# Altium integrated library PlantiumIntegratedLibrary.IntLib: 638 symbols (part 6 of 6)
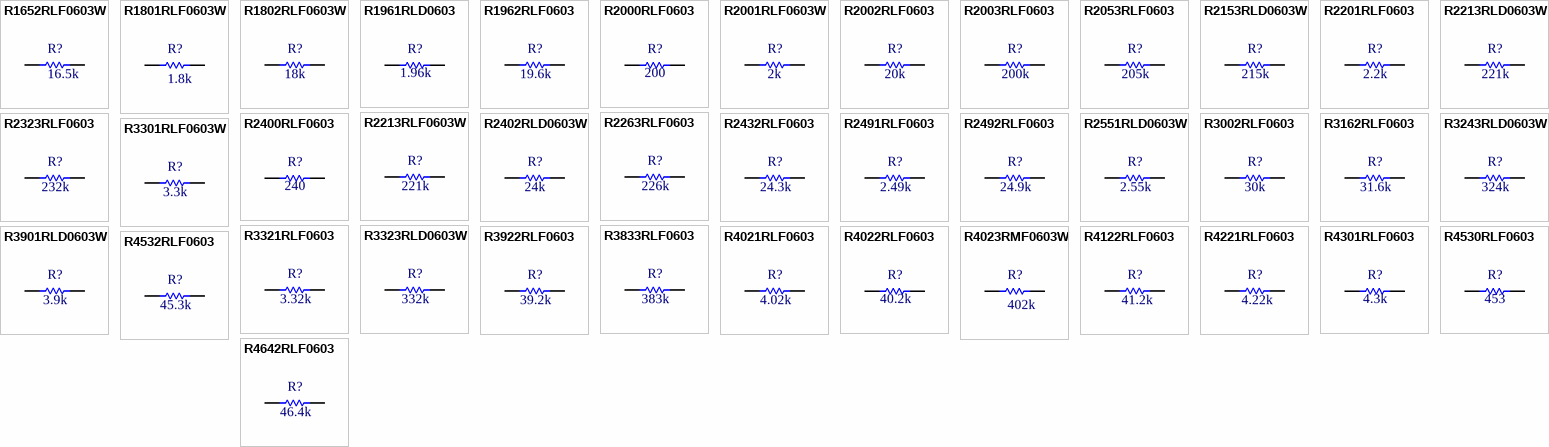
[diagram p38: symbols R1652RLF0603W to R4642RLF0603]

## R2432RLF0603
designator R?  value 24.3k
24.3 kOhms ±1% 0.1W, 1/10W Chip Resistor 0603 (1608 Metric) Automotive AEC-Q200 Thick Film; Manufacturer Part Number: ERJ-3EKF2432V; Manufacturer: Panasonic Electronic Components; Working Temperature: -55°C ~ 155°C; Temperature Coefficient: ±100ppm/°C; Short Description: RES SMD 24.3K OHM 1% 1/10W 0603; Ratings: REACH, ROHS3, AEC-Q200; Frequency: NC; Mounting: SMT; Power: 1/10W; Type: NC; Alternate Part Number 1: *; Alternate Part Number 2: *; Tolerance: ±1%; Current: NC; Revision Date: 02/08/21; Package Reference: 0603; Voltage: NC
footprint R0603 (Footprint not found)
pins: 1, 2

## R2491RLF0603
designator R?  value 2.49k
2.49 kOhms ±1% 0.1W, 1/10W Chip Resistor 0603 (1608 Metric) Automotive AEC-Q200 Thick Film; Manufacturer Part Number: ERJ-3EKF2491V; Manufacturer: Panasonic Electronic Components; Working Temperature: -55°C ~ 155°C; Temperature Coefficient: ±100ppm/°C; Short Description: RES SMD 2.49K OHM 1% 1/10W 0603; Ratings: REACH, ROHS3; Frequency: NC; Mounting: SMT; Power: 1/10W; Type: NC; Alternate Part Number 1: *; Alternate Part Number 2: *; Tolerance: ±1%; Current: NC; Revision Date: 11/05/22; Package Reference: 0603; Voltage: NC
footprint R0603 (Footprint not found)
pins: 1, 2

## R2492RLF0603
designator R?  value 24.9k
24.9 kOhms ±1% 0.1W, 1/10W Chip Resistor 0603 (1608 Metric) Automotive AEC-Q200 Thick Film; Manufacturer Part Number: ERJ-3EKF2492V; Manufacturer: Panasonic Electronic Components; Working Temperature: -55°C ~ 155°C; Temperature Coefficient: ±100ppm/°C; Short Description: RES SMD 24.9K OHM 1% 1/10W 0603; Ratings: REACH, ROHS3, AEC-Q200; Frequency: NC; Mounting: SMT; Power: 1/10W; Type: NC; Alternate Part Number 1: *; Alternate Part Number 2: *; Tolerance: ±1%; Current: NC; Revision Date: 02/08/21; Package Reference: 0603; Voltage: NC
footprint R0603 (Footprint not found)
pins: 1, 2

## R2551RLD0603W
designator R?  value 2.55k
2.55 kOhms ±0.5% 0.1W, 1/10W Chip Resistor 0603 (1608 Metric) - Thin Film; Manufacturer Part Number: RT0603DRD072K55L; Manufacturer: Yageo; Working Temperature: -55°C ~ 155°C; Temperature Coefficient: ±25ppm/°C; Short Description: RES SMD 2.55KOHM 0.5% 1/10W 0603; Ratings: REACH, ROHS3; Frequency: NC; Mounting: SMT; Power: 1/10W; Type: NC; Alternate Part Number 1: *; Alternate Part Number 2: *; Tolerance: ±0.5%; Current: NC; Revision Date: 02/08/21; Package Reference: 0603; Voltage: NC
footprint R0603 (Footprint not found)
pins: 1, 2

## R3002RLF0603
designator R?  value 30k
30 kOhms ±1% 0.1W, 1/10W Chip Resistor 0603 (1608 Metric) Automotive AEC-Q200 Thick Film; Manufacturer Part Number: ERJ-3EKF3002V; Manufacturer: Panasonic Electronic Components; Working Temperature: -55°C ~ 155°C; Temperature Coefficient: ±100ppm/°C; Short Description: RES SMD 30K OHM 1% 1/10W 0603; Ratings: REACH, ROHS3, AEC-Q200; Frequency: NC; Mounting: SMT; Power: 1/10W; Type: NC; Alternate Part Number 1: *; Alternate Part Number 2: *; Tolerance: ±1%; Current: NC; Revision Date: 02/08/21; Package Reference: 0603; Voltage: NC
footprint R0603 (Footprint not found)
pins: 1, 2

## R3162RLF0603
designator R?  value 31.6k
31.6 kOhms ±1% 0.1W, 1/10W Chip Resistor 0603 (1608 Metric) Automotive AEC-Q200 Thick Film; Manufacturer Part Number: ERJ-3EKF3162V; Manufacturer: Panasonic Electronic Components; Working Temperature: -55°C ~ 155°C; Temperature Coefficient: ±100ppm/°C; Short Description: RES SMD 31.6K OHM 1% 1/10W 0603; Ratings: REACH, ROHS3, AEC-Q200; Frequency: NC; Mounting: SMT; Power: 1/10W; Type: NC; Alternate Part Number 1: *; Alternate Part Number 2: *; Tolerance: ±1%; Current: NC; Revision Date: 02/08/21; Package Reference: 0603; Voltage: NC
footprint R0603 (Footprint not found)
pins: 1, 2

## R3243RLD0603W
designator R?  value 324k
324 kOhms ±0.5% 0.1W, 1/10W Chip Resistor 0603 (1608 Metric) - Thin Film; Manufacturer Part Number: RT0603DRD07324KL; Manufacturer: Yageo; Working Temperature: -55°C ~ 155°C; Temperature Coefficient: ±25ppm/°C; Short Description: RES SMD 324K OHM 0.5% 1/10W 0603; Ratings: REACH, ROHS3; Frequency: NC; Mounting: SMT; Power: 1/10W; Type: NC; Alternate Part Number 1: *; Alternate Part Number 2: *; Tolerance: ±0.5%; Current: NC; Revision Date: 02/08/21; Package Reference: 0603; Voltage: NC
footprint R0603 (Footprint not found)
pins: 1, 2

## R3301RLF0603W
designator R?  value 3.3k
3.3 kOhms ±1% 0.1W, 1/10W Chip Resistor 0603 (1608 Metric) Moisture Resistant Thick Film; Manufacturer Part Number: RC0603FR-073K3L; Manufacturer: Yageo; Working Temperature: -55°C ~ 155°C; Temperature Coefficient: ±100ppm/°C; Short Description: RES SMD 3.3K OHM 1% 1/10W 0603; Ratings: REACH, ROHS3; Frequency: NC; Mounting: SMT; Power: 1/10W; Type: NC; Alternate Part Number 1: *; Alternate Part Number 2: *; Tolerance: ±1%; Current: NC; Revision Date: 02/08/21; Package Reference: 0603; Voltage: NC
footprint R0603 (Footprint not found)
pins: 1, 2

## R3321RLF0603
designator R?  value 3.32k
3.32 kOhms ±1% 0.1W, 1/10W Chip Resistor 0603 (1608 Metric) Automotive AEC-Q200 Thick Film; Manufacturer Part Number: ERJ-3EKF3321V; Manufacturer: Panasonic Electronic Components; Working Temperature: -55°C ~ 155°C; Temperature Coefficient: ±100ppm/°C; Short Description: RES SMD 3.32K OHM 1% 1/10W 0603; Ratings: REACH, ROHS3, AEC-Q200; Frequency: NC; Mounting: SMT; Power: 1/10W; Type: NC; Alternate Part Number 1: *; Alternate Part Number 2: *; Tolerance: ±1%; Current: NC; Revision Date: 02/08/21; Package Reference: 0603; Voltage: NC
footprint R0603 (Footprint not found)
pins: 1, 2

## R3323RLD0603W
designator R?  value 332k
332 kOhms ±0.5% 0.1W, 1/10W Chip Resistor 0603 (1608 Metric) - Thin Film; Manufacturer Part Number: RT0603DRD07332KL; Manufacturer: Yageo; Working Temperature: -55°C ~ 155°C; Temperature Coefficient: ±25ppm/°C; Short Description: RES SMD 332K OHM 0.5% 1/10W 0603; Ratings: REACH, ROHS3; Frequency: NC; Mounting: SMT; Power: 1/10W; Type: NC; Alternate Part Number 1: *; Alternate Part Number 2: *; Tolerance: ±0.5%; Current: NC; Revision Date: 02/08/21; Package Reference: 0603; Voltage: NC
footprint R0603 (Footprint not found)
pins: 1, 2

## R3833RLF0603
designator R?  value 383k
383 kOhms ±1% 0.1W, 1/10W Chip Resistor 0603 (1608 Metric) Automotive AEC-Q200 Thick Film; Manufacturer Part Number: ERJ-3EKF3833V; Manufacturer: Panasonic Electronic Components; Working Temperature: -55°C ~ 155°C; Temperature Coefficient: ±100ppm/°C; Short Description: RES SMD 383K OHM 1% 1/10W 0603; Ratings: REACH, ROHS3, AEC-Q200; Frequency: NC; Mounting: SMT; Power: 1/10W; Type: NC; Alternate Part Number 1: *; Alternate Part Number 2: *; Tolerance: ±1%; Current: NC; Revision Date: 09/05/23; Package Reference: 0603; Voltage: NC
footprint R0603 (Footprint not found)
pins: 1, 2

## R3901RLD0603W
designator R?  value 3.9k
3.9 kOhms ±0.5% 0.1W, 1/10W Chip Resistor 0603 (1608 Metric) - Thin Film; Manufacturer Part Number: RT0603DRD073K9L; Manufacturer: Yageo; Working Temperature: -55°C ~ 155°C; Temperature Coefficient: ±25ppm/°C; Short Description: RES SMD 3.9K OHM 0.5% 1/10W 0603; Ratings: REACH, ROHS3; Frequency: NC; Mounting: SMT; Power: 1/10W; Type: NC; Alternate Part Number 1: *; Alternate Part Number 2: *; Tolerance: ±0.5%; Current: NC; Revision Date: 02/08/21; Package Reference: 0603; Voltage: NC
footprint R0603 (Footprint not found)
pins: 1, 2

## R3922RLF0603
designator R?  value 39.2k
39.2 kOhms ±1% 0.1W, 1/10W Chip Resistor 0603 (1608 Metric) Automotive AEC-Q200 Thick Film; Manufacturer Part Number: ERJ-3EKF3922V; Manufacturer: Panasonic Electronic Components; Working Temperature: -55°C ~ 155°C; Temperature Coefficient: ±100ppm/°C; Short Description: RES SMD 39.2K OHM 1% 1/10W 0603; Ratings: REACH, ROHS3, AEC-Q200; Frequency: NC; Mounting: SMT; Power: 1/10W; Type: NC; Alternate Part Number 1: *; Alternate Part Number 2: *; Tolerance: ±1%; Current: NC; Revision Date: 02/08/21; Package Reference: 0603; Voltage: NC
footprint R0603 (Footprint not found)
pins: 1, 2

## R4021RLF0603
designator R?  value 4.02k
4.02 kOhms ±1% 0.1W, 1/10W Chip Resistor 0603 (1608 Metric) Automotive AEC-Q200 Thick Film; Manufacturer Part Number: ERJ-3EKF4021V; Manufacturer: Panasonic Electronic Components; Working Temperature: -55°C ~ 155°C; Temperature Coefficient: ±100ppm/°C; Short Description: RES SMD 4.02K OHM 1% 1/10W 0603; Ratings: REACH, ROHS3, AEC-Q200; Frequency: NC; Mounting: SMT; Power: 1/10W; Type: NC; Alternate Part Number 1: *; Alternate Part Number 2: *; Tolerance: ±1%; Current: NC; Revision Date: 02/08/21; Package Reference: 0603; Voltage: NC
footprint R0603 (Footprint not found)
pins: 1, 2

## R4022RLF0603
designator R?  value 40.2k
40.2 kOhms ±1% 0.1W, 1/10W Chip Resistor 0603 (1608 Metric) Automotive AEC-Q200 Thick Film; Manufacturer Part Number: ERJ-3EKF4022V; Manufacturer: Panasonic Electronic Components; Working Temperature: -55°C ~ 155°C; Temperature Coefficient: ±100ppm/°C; Short Description: RES SMD 40.2K OHM 1% 1/10W 0603; Ratings: REACH, ROHS3, AEC-Q200; Frequency: NC; Mounting: SMT; Power: 1/10W; Type: NC; Alternate Part Number 1: *; Alternate Part Number 2: *; Tolerance: ±1%; Current: NC; Revision Date: 02/08/21; Package Reference: 0603; Voltage: NC
footprint R0603 (Footprint not found)
pins: 1, 2

## R4023RMF0603W
designator R?  value 402k
402 kOhms ±1% 0.125W, 1/8W Chip Resistor 0805 (2012 Metric) Moisture Resistant Thick Film; Manufacturer Part Number: RC0805FR-07402KL; Manufacturer: YAGEO; Working Temperature: -55°C ~ 155°C; Temperature Coefficient: ±100ppm/°C; Short Description: RES 402K OHM 1% 1/8W 0805; Ratings: REACH, ROHS3; Frequency: NC; Mounting: SMT; Power: 1/8W; Type: NC; Alternate Part Number 1: *; Alternate Part Number 2: *; Tolerance: ±1%; Current: NC; Revision Date: 24/11/21; Package Reference: 0603; Voltage: NC
footprint R0603 (Footprint not found)
pins: 1, 2

## R4122RLF0603
designator R?  value 41.2k  (hidden comment: R4122RLF0603)
41.2 kOhms ±1% 0.1W, 1/10W Chip Resistor 0603 (1608 Metric) Automotive AEC-Q200 Thick Film; Manufacturer Part Number: ERJ-3EKF4122V; Manufacturer: Panasonic Electronic Components; Working Temperature: -55°C ~ 155°C; Temperature Coefficient: ±100ppm/°C; Short Description: RES SMD 41.2K OHM 1% 1/10W 0603; Ratings: REACH, ROHS3, AEC-Q200; Frequency: NC; Mounting: SMT; Power: 1/10W; Type: NC; Alternate Part Number 1: *; Alternate Part Number 2: *; Tolerance: ±1%; Current: NC; Revision Date: 02/08/21; Package Reference: 0603; Voltage: NC
footprint R0603 (Footprint not found)
pins: 1, 2

## R4221RLF0603
designator R?  value 4.22k
4.22 kOhms ±1% 0.1W, 1/10W Chip Resistor 0603 (1608 Metric) Automotive AEC-Q200 Thick Film; Manufacturer Part Number: ERJ-3EKF4221V; Manufacturer: Panasonic Electronic Components; Working Temperature: -55°C ~ 155°C; Temperature Coefficient: ±100ppm/°C; Short Description: RES SMD 4.22K OHM 1% 1/10W 0603; Ratings: REACH, ROHS3, AEC-Q200; Frequency: NC; Mounting: SMT; Power: 1/10W; Type: NC; Alternate Part Number 1: *; Alternate Part Number 2: *; Tolerance: ±1%; Current: NC; Revision Date: 02/08/21; Package Reference: 0603; Voltage: NC
footprint R0603 (Footprint not found)
pins: 1, 2

## R4301RLF0603
designator R?  value 4.3k
4.3 kOhms ±1% 0.1W, 1/10W Chip Resistor 0603 (1608 Metric) Automotive AEC-Q200 Thick Film; Manufacturer Part Number: ERJ-3EKF4301V; Manufacturer: Panasonic Electronic Components; Working Temperature: -55°C ~ 155°C; Temperature Coefficient: ±100ppm/°C; Short Description: RES SMD 4.3K OHM 1% 1/10W 0603; Ratings: REACH, ROHS3, AEC-Q200; Frequency: NC; Mounting: SMT; Power: 1/10W; Type: NC; Alternate Part Number 1: *; Alternate Part Number 2: *; Tolerance: ±1%; Current: NC; Revision Date: 02/08/21; Package Reference: 0603; Voltage: NC
footprint R0603 (Footprint not found)
pins: 1, 2

## R4530RLF0603
designator R?  value 453
453 Ohms ±1% 0.1W, 1/10W Chip Resistor 0603 (1608 Metric) Automotive AEC-Q200 Thick Film; Manufacturer Part Number: ERJ-3EKF4530V; Manufacturer: Panasonic Electronic Components; Working Temperature: -55°C ~ 155°C; Temperature Coefficient: ±100ppm/°C; Short Description: RES SMD 453 OHM 1% 1/10W 0603; Ratings: REACH, ROHS3, AEC-Q200; Frequency: NC; Mounting: SMT; Power: 1/10W; Type: NC; Alternate Part Number 1: *; Alternate Part Number 2: *; Tolerance: ±1%; Current: NC; Revision Date: 02/08/21; Package Reference: 0603; Voltage: NC
footprint R0603 (Footprint not found)
pins: 1, 2

## R4532RLF0603
designator R?  value 45.3k
45.3 kOhms ±1% 0.1W, 1/10W Chip Resistor 0603 (1608 Metric) Automotive AEC-Q200 Thick Film; Manufacturer Part Number: ERJ-3EKF4532V; Manufacturer: Panasonic Electronic Components; Working Temperature: -55°C ~ 155°C; Temperature Coefficient: ±100ppm/°C; Short Description: RES SMD 45.3K OHM 1% 1/10W 0603; Ratings: REACH, ROHS3, AEC-Q200; Frequency: NC; Mounting: SMT; Power: 1/10W; Type: NC; Alternate Part Number 1: *; Alternate Part Number 2: *; Tolerance: ±1%; Current: NC; Revision Date: 02/08/21; Package Reference: 0603; Voltage: NC
footprint R0603 (Footprint not found)
pins: 1, 2

## R4642RLF0603
designator R?  value 46.4k  (hidden comment: R4642RLF0603)
46.4 kOhms ±1% 0.1W, 1/10W Chip Resistor 0603 (1608 Metric) - Thin Film; Manufacturer Part Number: ERJ-3EKF4642V; Manufacturer: Panasonic; Working Temperature: -55°C ~ 155°C; Temperature Coefficient: ±100ppm/°C; Short Description: RES SMD 46.4 KOHM 1% 1/10W 0603; Ratings: REACH, ROHS3; Frequency: NC; Mounting: SMT; Power: 1/10W; Type: NC; Alternate Part Number 1: *; Alternate Part Number 2: *; Tolerance: ±1%; Current: NC; Revision Date: 02/08/21; Package Reference: 0603; Voltage: NC
footprint R0603 (Footprint not found)
pins: 1, 2

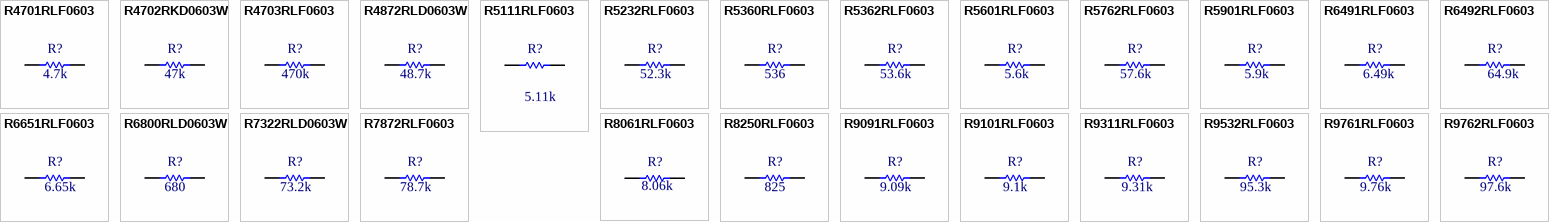
[diagram p33: symbols R4701RLF0603 to R9762RLF0603]

## R4701RLF0603
designator R?  value 4.7k
4.7 kOhms ±1% 0.1W, 1/10W Chip Resistor 0603 (1608 Metric) Automotive AEC-Q200 Thick Film; Manufacturer Part Number: ERJ-3EKF4701V; Manufacturer: Panasonic Electronic Components; Working Temperature: -55°C ~ 155°C; Temperature Coefficient: ±100ppm/°C; Short Description: RES SMD 4.7K OHM 1% 1/10W 0603; Ratings: REACH, ROHS3, AEC-Q200; Frequency: NC; Mounting: SMT; Power: 1/10W; Type: NC; Alternate Part Number 1: *; Alternate Part Number 2: *; Tolerance: ±1%; Current: NC; Revision Date: 02/08/21; Package Reference: 0603; Voltage: NC
footprint R0603 (Footprint not found)
pins: 1, 2

## R4702RKD0603W
designator R?  value 47k
47 kOhms ±0.5% 0.063W, 1/16W Chip Resistor 0603 (1608 Metric) - Thin Film; Manufacturer Part Number: RR0816P-473-D; Manufacturer: Susumu; Working Temperature: -55°C ~ 155°C; Temperature Coefficient: ±25ppm/°C; Short Description: RES SMD 47K OHM 0.5% 1/16W 0603; Ratings: REACH, ROHS3; Frequency: NC; Mounting: SMT; Power: 1/16W; Type: NC; Alternate Part Number 1: *; Alternate Part Number 2: *; Tolerance: ±0.5%; Current: NC; Revision Date: 02/08/21; Package Reference: 0603; Voltage: NC
footprint R0603 (Footprint not found)
pins: 1, 2

## R4703RLF0603
designator R?  value 470k
470 kOhms ±1% 0.1W, 1/10W Chip Resistor 0603 (1608 Metric) Automotive AEC-Q200 Thick Film; Manufacturer Part Number: ERJ-3EKF4703V; Manufacturer: Panasonic Electronic Components; Working Temperature: -55°C ~ 155°C; Temperature Coefficient: ±100ppm/°C; Short Description: RES SMD 470K OHM 1% 1/10W 0603; Ratings: REACH, ROHS3, AEC-Q200; Frequency: NC; Mounting: SMT; Power: 1/10W; Type: NC; Alternate Part Number 1: *; Alternate Part Number 2: *; Tolerance: ±1%; Current: NC; Revision Date: 02/08/21; Package Reference: 0603; Voltage: NC
footprint R0603 (Footprint not found)
pins: 1, 2

## R4872RLD0603W
designator R?  value 48.7k
48.7 kOhms ±0.5% 0.1W, 1/10W Chip Resistor 0603 (1608 Metric) - Thin Film; Manufacturer Part Number: RT0603DRD0748K7L; Manufacturer: Yageo; Working Temperature: -55°C ~ 155°C; Temperature Coefficient: ±25ppm/°C; Short Description: RES SMD 48.7KOHM 0.5% 1/10W 0603; Ratings: REACH, ROHS3; Frequency: NC; Mounting: SMT; Power: 1/10W; Type: NC; Alternate Part Number 1: *; Alternate Part Number 2: *; Tolerance: ±0.5%; Current: NC; Revision Date: 02/08/21; Package Reference: 0603; Voltage: NC
footprint R0603 (Footprint not found)
pins: 1, 2

## R5111RLF0603
designator R?  value 5.11k
5.11 kOhms ±1% 0.1W, 1/10W Chip Resistor 0603 (1608 Metric) Automotive AEC-Q200 Thick Film; Manufacturer Part Number: ERJ-3EKF5111V; Manufacturer: Panasonic Electronic Components; Working Temperature: -55°C ~ 155°C; Temperature Coefficient: ±100ppm/°C; Short Description: RES SMD 5.11K OHM 1% 1/10W 0603; Ratings: REACH, ROHS3, AEC-Q200; Frequency: NC; Mounting: SMT; Power: 1/10W; Type: NC; Alternate Part Number 1: *; Alternate Part Number 2: *; Tolerance: ±1%; Current: NC; Revision Date: 02/08/21; Package Reference: 0603; Voltage: NC
footprint R0603 (Footprint not found)
pins: 1, 2

## R5232RLF0603
designator R?  value 52.3k
52.3 kOhms ±1% 0.1W, 1/10W Chip Resistor 0603 (1608 Metric) Automotive AEC-Q200 Thick Film; Manufacturer Part Number: ERJ-3EKF5232V; Manufacturer: Panasonic Electronic Components; Working Temperature: -55°C ~ 155°C; Temperature Coefficient: ±100ppm/°C; Short Description: RES SMD 52.3K OHM 1% 1/10W 0603; Ratings: REACH, ROHS3, AEC-Q200; Frequency: NC; Mounting: SMT; Power: 1/10W; Type: NC; Alternate Part Number 1: *; Alternate Part Number 2: *; Tolerance: ±1%; Current: NC; Revision Date: 02/08/21; Package Reference: 0603; Voltage: NC
footprint R0603 (Footprint not found)
pins: 1, 2

## R5360RLF0603
designator R?  value 536
536 Ohms ±1% 0.1W, 1/10W Chip Resistor 0603 (1608 Metric) Automotive AEC-Q200 Thick Film; Manufacturer Part Number: ERJ-3EKF5360V; Manufacturer: Panasonic Electronic Components; Working Temperature: -55°C ~ 155°C; Temperature Coefficient: ±100ppm/°C; Short Description: RES SMD 536 OHM 1% 1/10W 0603; Ratings: REACH, ROHS3, AEC-Q200; Frequency: NC; Mounting: SMT; Power: 1/10W; Type: NC; Alternate Part Number 1: *; Alternate Part Number 2: *; Tolerance: ±1%; Current: NC; Revision Date: 02/08/21; Package Reference: 0603; Voltage: NC
footprint R0603 (Footprint not found)
pins: 1, 2

## R5362RLF0603
designator R?  value 53.6k
53.6 kOhms ±1% 0.1W, 1/10W Chip Resistor 0603 (1608 Metric) Automotive AEC-Q200 Thick Film; Manufacturer Part Number: ERJ-3EKF5362V; Manufacturer: Panasonic Electronic Components; Working Temperature: -55°C ~ 155°C; Temperature Coefficient: ±100ppm/°C; Short Description: RES SMD 53.6K OHM 1% 1/10W 0603; Ratings: REACH, ROHS3, AEC-Q200; Frequency: NC; Mounting: SMT; Power: 1/10W; Type: NC; Alternate Part Number 1: *; Alternate Part Number 2: *; Tolerance: ±1%; Current: NC; Revision Date: 02/08/21; Package Reference: 0603; Voltage: NC
footprint R0603 (Footprint not found)
pins: 1, 2

## R5601RLF0603
designator R?  value 5.6k
5.6 kOhms ±1% 0.1W, 1/10W Chip Resistor 0603 (1608 Metric) Automotive AEC-Q200 Thick Film; Manufacturer Part Number: ERJ-3EKF5601V; Manufacturer: Panasonic Electronic Components; Working Temperature: -55°C ~ 155°C; Temperature Coefficient: ±100ppm/°C; Short Description: RES SMD 5.6K OHM 1% 1/10W 0603; Ratings: REACH, ROHS3, AEC-Q200; Frequency: NC; Mounting: SMT; Power: 1/10W; Type: NC; Alternate Part Number 1: *; Alternate Part Number 2: *; Tolerance: ±1%; Current: NC; Revision Date: 02/08/21; Package Reference: 0603; Voltage: NC
footprint R0603 (Footprint not found)
pins: 1, 2

## R5762RLF0603
designator R?  value 57.6k
57.6 kOhms ±1% 0.1W, 1/10W Chip Resistor 0603 (1608 Metric) Automotive AEC-Q200 Thick Film; Manufacturer Part Number: ERJ-3EKF5762V; Manufacturer: Panasonic Electronic Components; Working Temperature: -55°C ~ 155°C; Temperature Coefficient: ±100ppm/°C; Short Description: RES SMD 57.6K OHM 1% 1/10W 0603; Ratings: REACH, ROHS3, AEC-Q200; Frequency: NC; Mounting: SMT; Power: 1/10W; Type: NC; Alternate Part Number 1: *; Alternate Part Number 2: *; Tolerance: ±1%; Current: NC; Revision Date: 02/08/21; Package Reference: 0603; Voltage: NC
footprint R0603 (Footprint not found)
pins: 1, 2

## R5901RLF0603
designator R?  value 5.9k
5.9 kOhms ±1% 0.1W, 1/10W Chip Resistor 0603 (1608 Metric) Automotive AEC-Q200 Thick Film; Manufacturer Part Number: ERJ-3EKF5901V; Manufacturer: Panasonic Electronic Components; Working Temperature: -55°C ~ 155°C; Temperature Coefficient: ±100ppm/°C; Short Description: RES SMD 5.9K OHM 1% 1/10W 0603; Ratings: REACH, ROHS3, AEC-Q200; Frequency: NC; Mounting: SMT; Power: 1/10W; Type: NC; Alternate Part Number 1: *; Alternate Part Number 2: *; Tolerance: ±1%; Current: NC; Revision Date: 02/08/21; Package Reference: 0603; Voltage: NC
footprint R0603 (Footprint not found)
pins: 1, 2

## R6491RLF0603
designator R?  value 6.49k
6.49 kOhms ±1% 0.1W, 1/10W Chip Resistor 0603 (1608 Metric) Automotive AEC-Q200 Thick Film; Manufacturer Part Number: RMCF0603FT6K49; Alternate Part Number 1: AC0603FR-076K49L; Manufacturer: Stackpole Electronics Inc; Working Temperature: -55°C ~ 155°C; Temperature Coefficient: ±100ppm/°C; Short Description: RES 6.49K OHM 1% 1/10W 0603; Ratings: REACH, ROHS3, AEC-Q200; Frequency: NC; Mounting: SMT; Power: 1/10W; Type: NC; Alternate Part Number 2: *; Tolerance: ±1%; Current: NC; Revision Date: 21/10/21; Package Reference: 0603; Voltage: NC
footprint R0603 (Footprint not found)
pins: 1, 2

## R6492RLF0603
designator R?  value 64.9k
64.9 kOhms ±1% 0.1W, 1/10W Chip Resistor 0603 (1608 Metric) Automotive AEC-Q200 Thick Film; Manufacturer Part Number: ERJ-3EKF6492V; Manufacturer: Panasonic Electronic Components; Working Temperature: -55°C ~ 155°C; Temperature Coefficient: ±100ppm/°C; Short Description: RES SMD 64.9K OHM 1% 1/10W 0603; Ratings: REACH, ROHS3, AEC-Q200; Frequency: NC; Mounting: SMT; Power: 1/10W; Type: NC; Alternate Part Number 1: *; Alternate Part Number 2: *; Tolerance: ±1%; Current: NC; Revision Date: 13/10/21; Package Reference: 0603; Voltage: NC
footprint R0603 (Footprint not found)
pins: 1, 2

## R6651RLF0603
designator R?  value 6.65k
6.65k Ohms ±1% 0.1W, 1/10W Chip Resistor 0603 (1608 Metric) Automotive AEC-Q200 Thick Film; Manufacturer Part Number: ERJ-3GEYJ181V; Manufacturer: Panasonic Electronic Components; Working Temperature: -55°C ~ 155°C; Temperature Coefficient: ±100ppm/°C; Short Description: RES 6.65K OHM 1/10W 1% 0603; Ratings: REACH, ROHS3, AEC-Q200; Frequency: NC; Mounting: SMT; Power: 1/10W; Type: NC; Alternate Part Number 1: *; Alternate Part Number 2: *; Tolerance: ±1%; Current: NC; Revision Date: 02/08/21; Package Reference: 0603; Voltage: NC
footprint R0603 (Footprint not found)
pins: 1, 2

## R6800RLD0603W
designator R?  value 680
680 Ohms ±0.5% 0.1W, 1/10W Chip Resistor 0603 (1608 Metric) - Thin Film; Manufacturer Part Number: RT0603DRD07680RL; Manufacturer: Yageo; Working Temperature: -55°C ~ 155°C; Temperature Coefficient: ±25ppm/°C; Short Description: RES SMD 680 OHM 0.5% 1/10W 0603; Ratings: REACH, ROHS3; Frequency: NC; Mounting: SMT; Power: 1/10W; Type: NC; Alternate Part Number 1: *; Alternate Part Number 2: *; Tolerance: ±0.5%; Current: NC; Revision Date: 02/08/21; Package Reference: 0603; Voltage: NC
footprint R0603 (Footprint not found)
pins: 1, 2

## R7322RLD0603W
designator R?  value 73.2k
73.2 kOhms ±0.5% 0.1W, 1/10W Chip Resistor 0603 (1608 Metric) - Thin Film; Manufacturer Part Number: RT0603DRD0773K2L; Manufacturer: Yageo; Working Temperature: -55°C ~ 155°C; Temperature Coefficient: ±25ppm/°C; Short Description: RES SMD 73.2KOHM 0.5% 1/10W 0603; Ratings: REACH, ROHS3; Frequency: NC; Mounting: SMT; Power: 1/10W; Type: NC; Alternate Part Number 1: *; Alternate Part Number 2: *; Tolerance: ±0.5%; Current: NC; Revision Date: 02/08/21; Package Reference: 0603; Voltage: NC
footprint R0603 (Footprint not found)
pins: 1, 2

## R7872RLF0603
designator R?  value 78.7k
78.7 kOhms ±1% 0.1W, 1/10W Chip Resistor 0603 (1608 Metric) Automotive AEC-Q200 Thick Film; Manufacturer Part Number: ERJ-3EKF7872V; Manufacturer: Panasonic Electronic Components; Working Temperature: -55°C ~ 155°C; Temperature Coefficient: ±100ppm/°C; Short Description: RES SMD 78.7K OHM 1% 1/10W 0603; Ratings: REACH, ROHS3, AEC-Q200; Frequency: NC; Mounting: SMT; Power: 1/10W; Type: NC; Alternate Part Number 1: *; Alternate Part Number 2: *; Tolerance: ±1%; Current: NC; Revision Date: 02/08/21; Package Reference: 0603; Voltage: NC
footprint R0603 (Footprint not found)
pins: 1, 2

## R8061RLF0603
designator R?  value 8.06k
8.06 kOhms ±1% 0.1W, 1/10W Chip Resistor 0603 (1608 Metric) Automotive AEC-Q200 Thick Film; Manufacturer Part Number: ERJ-3EKF8061V; Manufacturer: Panasonic Electronic Components; Working Temperature: -55°C ~ 155°C; Temperature Coefficient: ±100ppm/°C; Short Description: RES SMD 8.06K OHM 1% 1/10W 0603; Ratings: REACH, ROHS3, AEC-Q200; Frequency: NC; Mounting: SMT; Power: 1/10W; Type: NC; Alternate Part Number 1: *; Alternate Part Number 2: *; Tolerance: ±1%; Current: NC; Revision Date: 02/08/21; Package Reference: 0603; Voltage: NC
footprint R0603 (Footprint not found)
pins: 1, 2

## R8250RLF0603
designator R?  value 825
825 Ohms ±1% 0.1W, 1/10W Chip Resistor 0603 (1608 Metric) Automotive AEC-Q200 Thick Film; Manufacturer Part Number: ERJ-3EKF8250V; Manufacturer: Panasonic Electronic Components; Working Temperature: -55°C ~ 155°C; Temperature Coefficient: ±100ppm/°C; Short Description: RES SMD 825 OHM 1% 1/10W 0603; Ratings: REACH, ROHS3, AEC-Q200; Frequency: NC; Mounting: SMT; Power: 1/10W; Type: NC; Alternate Part Number 1: *; Alternate Part Number 2: *; Tolerance: ±1%; Current: NC; Revision Date: 02/08/21; Package Reference: 0603; Voltage: NC
footprint R0603 (Footprint not found)
pins: 1, 2

## R9091RLF0603
designator R?  value 9.09k
9.09 kOhms ±1% 0.1W, 1/10W Chip Resistor 0603 (1608 Metric) Automotive AEC-Q200 Thick Film; Manufacturer Part Number: ERJ-3EKF9091V; Manufacturer: Panasonic Electronic Components; Working Temperature: -55°C ~ 155°C; Temperature Coefficient: ±100ppm/°C; Short Description: RES SMD 9.09K OHM 1% 1/10W 0603; Ratings: REACH, ROHS3, AEC-Q200; Frequency: NC; Mounting: SMT; Power: 1/10W; Type: NC; Alternate Part Number 1: *; Alternate Part Number 2: *; Tolerance: ±1%; Current: NC; Revision Date: 02/08/21; Package Reference: 0603; Voltage: NC
footprint R0603 (Footprint not found)
pins: 1, 2

## R9101RLF0603
designator R?  value 9.1k
9.1 kOhms ±1% 0.1W, 1/10W Chip Resistor 0603 (1608 Metric) Automotive AEC-Q200 Thick Film; Manufacturer Part Number: ERJ-3EKF9101V; Manufacturer: Panasonic Electronic Components; Working Temperature: -55°C ~ 155°C; Temperature Coefficient: ±100ppm/°C; Short Description: RES SMD 9.1K OHM 1% 1/10W 0603; Ratings: REACH, ROHS3, AEC-Q200; Frequency: NC; Mounting: SMT; Power: 1/10W; Type: NC; Alternate Part Number 1: *; Alternate Part Number 2: *; Tolerance: ±1%; Current: NC; Revision Date: 02/08/21; Package Reference: 0603; Voltage: NC
footprint R0603 (Footprint not found)
pins: 1, 2

## R9311RLF0603
designator R?  value 9.31k
9.31 kOhms ±1% 0.1W, 1/10W Chip Resistor 0603 (1608 Metric) Automotive AEC-Q200 Thick Film; Manufacturer Part Number: ERJ-3EKF9311V; Manufacturer: Panasonic Electronic Components; Working Temperature: -55°C ~ 155°C; Temperature Coefficient: ±100ppm/°C; Short Description: RES SMD 9.31K OHM 1% 1/10W 0603; Ratings: REACH, ROHS3, AEC-Q200; Frequency: NC; Mounting: SMT; Power: 1/10W; Type: NC; Alternate Part Number 1: *; Alternate Part Number 2: *; Tolerance: ±1%; Current: NC; Revision Date: 02/08/21; Package Reference: 0603; Voltage: NC
footprint R0603 (Footprint not found)
pins: 1, 2

## R9532RLF0603
designator R?  value 95.3k
95.3 kOhms ±1% 0.1W, 1/10W Chip Resistor 0603 (1608 Metric) Automotive AEC-Q200 Thick Film; Manufacturer Part Number: ERJ-3EKF9532V; Manufacturer: Panasonic Electronic Components; Working Temperature: -55°C ~ 155°C; Temperature Coefficient: ±100ppm/°C; Short Description: RES SMD 95.3K OHM 1% 1/10W 0603; Ratings: REACH, ROHS3, AEC-Q200; Frequency: NC; Mounting: SMT; Power: 1/10W; Type: NC; Alternate Part Number 1: *; Alternate Part Number 2: *; Tolerance: ±1%; Current: NC; Revision Date: 02/08/21; Package Reference: 0603; Voltage: NC
footprint R0603 (Footprint not found)
pins: 1, 2

## R9761RLF0603
designator R?  value 9.76k
9.76 kOhms ±1% 0.1W, 1/10W Chip Resistor 0603 (1608 Metric) Automotive AEC-Q200 Thick Film; Manufacturer Part Number: ERJ-3EKF9761V; Manufacturer: Panasonic Electronic Components; Working Temperature: -55°C ~ 155°C; Temperature Coefficient: ±100ppm/°C; Short Description: RES SMD 9.76K OHM 1% 1/10W 0603; Ratings: REACH, ROHS3, AEC-Q200; Frequency: NC; Mounting: SMT; Power: 1/10W; Type: NC; Alternate Part Number 1: *; Alternate Part Number 2: *; Tolerance: ±1%; Current: NC; Revision Date: 02/08/21; Package Reference: 0603; Voltage: NC
footprint R0603 (Footprint not found)
pins: 1, 2

## R9762RLF0603
designator R?  value 97.6k
97.6 kOhms ±1% 0.1W, 1/10W Chip Resistor 0603 (1608 Metric) Automotive AEC-Q200 Thick Film; Manufacturer Part Number: ERJ-3EKF9762V; Manufacturer: Panasonic Electronic Components; Working Temperature: -55°C ~ 155°C; Temperature Coefficient: ±100ppm/°C; Short Description: RES SMD 97.6K OHM 1% 1/10W 0603; Ratings: REACH, ROHS3, AEC-Q200; Frequency: NC; Mounting: SMT; Power: 1/10W; Type: NC; Alternate Part Number 1: *; Alternate Part Number 2: *; Tolerance: ±1%; Current: NC; Revision Date: 02/08/21; Package Reference: 0603; Voltage: NC
footprint R0603 (Footprint not found)
pins: 1, 2


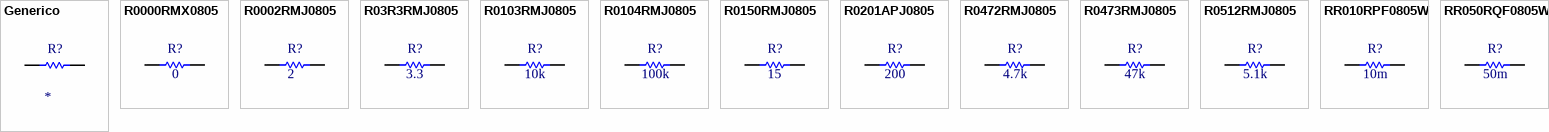
[diagram p34: symbols Generico to RR050RQF0805W]

## Generico
designator R?
Frequency: NC; Manufacturer Part Number: *; Working Temperature: *; Temperature Coefficient: *; Mounting: *; Short Description: *; Power: *; Ratings: *; Type: NC; Alternate Part Number 1: *; Alternate Part Number 2: *; Manufacturer: *; Tolerance: *; Current: NC; Revision Date: *; Package Reference: *; Voltage: NC; Value: *
footprint R0805 (Footprint not found)
pins: 1, 2

## R0000RMX0805
designator R?  value 0
0 Ohms Jumper 0.125W, 1/8W Chip Resistor 0805 (2012 Metric) Automotive AEC-Q200 Thick Film; Manufacturer Part Number: ERJ-6GEY0R00V; Manufacturer: Panasonic Electronic Components; Working Temperature: -55°C ~ 155°C; Short Description: RES 0 OHM 1/8W JUMPER 0805; Ratings: REACH, ROSH3, AEC-Q200; Frequency: NC; Temperature Coefficient: *; Mounting: SMT; Power: 1/8W; Type: NC; Alternate Part Number 1: *; Alternate Part Number 2: *; Tolerance: *; Current: NC; Revision Date: 02/08/21; Package Reference: 0805; Voltage: NC
footprint R0805 (Footprint not found)
pins: 1, 2

## R0002RMJ0805
designator R?  value 2
2 Ohms ±5% 0.125W, 1/8W Chip Resistor 0805 (2012 Metric) Automotive AEC-Q200 Thick Film; Manufacturer Part Number: ERJ-6GEYJ2R0V; Manufacturer: Panasonic Electronic Components; Working Temperature: -55°C ~ 155°C; Temperature Coefficient: -100/ +600ppm/°C; Short Description: RES SMD 2 OHM 5% 1/8W 0805; Ratings: REACH, ROSH3, AEC-Q200; Frequency: NC; Mounting: SMT; Power: 1/8W; Type: NC; Alternate Part Number 1: *; Alternate Part Number 2: *; Tolerance: ±5%; Current: NC; Revision Date: 21/09/21; Package Reference: 0805; Voltage: NC
footprint R0805 (Footprint not found)
pins: 1, 2

## R03R3RMJ0805
designator R?  value 3.3
3.3 Ohms ±5% 0.125W, 1/8W Chip Resistor 0805 (2012 Metric) Automotive AEC-Q200 Thick Film; Manufacturer Part Number: ERJ-6GEYJ3R3V; Manufacturer: Panasonic Electronic Components; Working Temperature: -55°C ~ 155°C; Temperature Coefficient: -100/ +600ppm/°C; Short Description: RES 3.3 OHM 1/8W 5% 0805; Ratings: REACH, ROSH3, AEC-Q200; Frequency: NC; Mounting: SMT; Power: 1/8W; Type: NC; Alternate Part Number 1: *; Alternate Part Number 2: *; Tolerance: ±5%; Current: NC; Revision Date: 02/08/21; Package Reference: 0805; Voltage: NC
footprint R0805 (Footprint not found)
pins: 1, 2

## R0103RMJ0805
designator R?  value 10k
10 kOhms ±5% 0.125W, 1/8W Chip Resistor 0805 (2012 Metric) Automotive AEC-Q200 Thick Film; Manufacturer Part Number: ERJ-6GEYJ103V; Manufacturer: Panasonic Electronic Components; Working Temperature: -55°C ~ 155°C; Temperature Coefficient: ±200ppm/°C; Short Description: RES SMD 10K OHM 5% 1/8W 0805; Ratings: REACH, ROSH3, AEC-Q200; Frequency: NC; Mounting: SMT; Power: 1/8W; Type: NC; Alternate Part Number 1: *; Alternate Part Number 2: *; Tolerance: ±5%; Current: NC; Revision Date: 02/08/21; Package Reference: 0805; Voltage: NC
footprint R0805 (Footprint not found)
pins: 1, 2

## R0104RMJ0805
designator R?  value 100k
100 kOhms ±5% 0.125W, 1/8W Chip Resistor 0805 (2012 Metric) Automotive AEC-Q200 Thick Film; Manufacturer Part Number: ERJ-6GEYJ104V; Manufacturer: Panasonic Electronic Components; Working Temperature: -55°C ~ 155°C; Temperature Coefficient: ±200ppm/°C; Short Description: RES 100K OHM 1/8W 5% 0805; Ratings: REACH, ROSH3, AEC-Q200; Frequency: NC; Mounting: SMT; Power: 1/8W; Type: NC; Alternate Part Number 1: *; Alternate Part Number 2: *; Tolerance: ±5%; Current: NC; Revision Date: 02/08/21; Package Reference: 0805; Voltage: NC
footprint R0805 (Footprint not found)
pins: 1, 2

## R0150RMJ0805
designator R?  value 15
15 Ohms ±5% 0.125W, 1/8W Chip Resistor 0805 (2012 Metric) Automotive AEC-Q200 Thick Film; Manufacturer Part Number: ERJ-6GEYJ150V; Manufacturer: Panasonic Electronic Components; Working Temperature: -55°C ~ 155°C; Temperature Coefficient: ±200ppm/°C; Short Description: RES 15 OHM 1/8W 5% 0805; Ratings: REACH, ROSH3, AEC-Q200; Frequency: NC; Mounting: SMT; Power: 1/8W; Type: NC; Alternate Part Number 1: *; Alternate Part Number 2: *; Tolerance: ±5%; Current: NC; Revision Date: 02/08/21; Package Reference: 0805; Voltage: NC
footprint R0805 (Footprint not found)
pins: 1, 2

## R0201APJ0805
designator R?  value 200
200 Ohms ±5% 0.5W, 1/2W Chip Resistor 0805 (2012 Metric) Automotive AEC-Q200, Pulse Withstanding Thick Film; Manufacturer Part Number: ERJ-P06J201V; Manufacturer: Panasonic Electronic Components; Working Temperature: -55°C ~ 155°C; Temperature Coefficient: ±200ppm/°C; Short Description: RES ANTISURGE 200 1/2W 5% 0805; Power: 1/8W; Ratings: REACH, ROSH3, AEC-Q200; Frequency: NC; Mounting: SMT; Type: NC; Alternate Part Number 1: *; Alternate Part Number 2: *; Tolerance: ±5%; Current: NC; Revision Date: 02/08/21; Package Reference: 0805; Voltage: NC
footprint R0805 (Footprint not found)
pins: 1, 2

## R0472RMJ0805
designator R?  value 4.7k
4.7 kOhms ±5% 0.125W, 1/8W Chip Resistor 0805 (2012 Metric) Automotive AEC-Q200 Thick Film; Manufacturer Part Number: ERJ-6GEYJ472V; Manufacturer: Panasonic Electronic Components; Working Temperature: -55°C ~ 155°C; Temperature Coefficient: ±200ppm/°C; Short Description: RES 4.7K OHM 1/8W 5% 0805; Ratings: REACH, ROSH3, AEC-Q200; Frequency: NC; Mounting: SMT; Power: 1/8W; Type: NC; Alternate Part Number 1: *; Alternate Part Number 2: *; Tolerance: ±5%; Current: NC; Revision Date: 02/08/21; Package Reference: 0805; Voltage: NC
footprint R0805 (Footprint not found)
pins: 1, 2

## R0473RMJ0805
designator R?  value 47k
47 kOhms ±5% 0.125W, 1/8W Chip Resistor 0805 (2012 Metric) Automotive AEC-Q200 Thick Film; Manufacturer Part Number: ERJ-6GEYJ473V; Manufacturer: Panasonic Electronic Components; Working Temperature: -55°C ~ 155°C; Temperature Coefficient: ±200ppm/°C; Short Description: RES 47K OHM 1/8W 5% 0805; Ratings: REACH, ROSH3, AEC-Q200; Frequency: NC; Mounting: SMT; Power: 1/8W; Type: NC; Alternate Part Number 1: *; Alternate Part Number 2: *; Tolerance: ±5%; Current: NC; Revision Date: 02/08/21; Package Reference: 0805; Voltage: NC
footprint R0805 (Footprint not found)
pins: 1, 2

## R0512RMJ0805
designator R?  value 5.1k
5.1 kOhms ±5% 0.125W, 1/8W Chip Resistor 0805 (2012 Metric) Automotive AEC-Q200 Thick Film; Manufacturer Part Number: ERJ-6GEYJ512V; Manufacturer: Panasonic Electronic Components; Working Temperature: -55°C ~ 155°C; Temperature Coefficient: ±200ppm/°C; Short Description: RES 5.1K OHM 1/8W 5% 0805; Ratings: REACH, ROSH3, AEC-Q200; Frequency: NC; Mounting: SMT; Power: 1/8W; Type: NC; Alternate Part Number 1: *; Alternate Part Number 2: *; Tolerance: ±5%; Current: NC; Revision Date: 02/08/21; Package Reference: 0805; Voltage: NC
footprint R0805 (Footprint not found)
pins: 1, 2

## RR010RPF0805W
designator R?  value 10m
10 mOhms ±1% 0.5W, 1/2W Chip Resistor 0805 (2012 Metric) Current Sense, Moisture Resistant Thick Film; Manufacturer Part Number: RUK2012FR010CS; Manufacturer: Panasonic Electronic Components; Working Temperature: -55°C ~ 155°C; Temperature Coefficient: ±100ppm/°C; Short Description: RES 0.01 OHM 1/2W 1% 0805; Ratings: REACH, ROSH3; Frequency: NC; Mounting: SMT; Power: 1/2W; Type: NC; Alternate Part Number 1: *; Alternate Part Number 2: *; Tolerance: ±1%; Current: NC; Revision Date: 02/08/21; Package Reference: 0805; Voltage: NC
footprint R0805 (Footprint not found)
pins: 1, 2

## RR050RQF0805W
designator R?  value 50m
50 mOhms ±1% 0.75W, 3/4W Chip Resistor 0805 (2012 Metric) Current Sense, Flame Retardant Coating, Safety Metal Element; Manufacturer Part Number: MCS1320R050FER; Alternate Part Number 1: WSLP0805R0500FEA; Manufacturer: Ohmite; Working Temperature: -55°C ~ 150°C; Temperature Coefficient: ±50ppm/°C; Short Description: RES 0.05 OHM 3/4W 1% 0805; Ratings: REACH, ROSH3; Frequency: NC; Mounting: SMT; Power: 3/4W; Type: NC; Alternate Part Number 2: *; Tolerance: ±1%; Current: NC; Revision Date: 21/10/21; Package Reference: 0805; Voltage: NC
footprint R0805 (Footprint not found)
pins: 1, 2